# Altium footprint library 元件1.PcbLib: 420 footprints (part 10 of 27)
Each footprint in its own frame and in the unit in brackets; x right, y up, seen from the top. Pads: shape width x height; smd on the part's side, far side on the other; paste and mask are expansions set on the pad; w line width, h text height; cw(c..) or ccw(c..) is an arc to the next point about the centre after c.
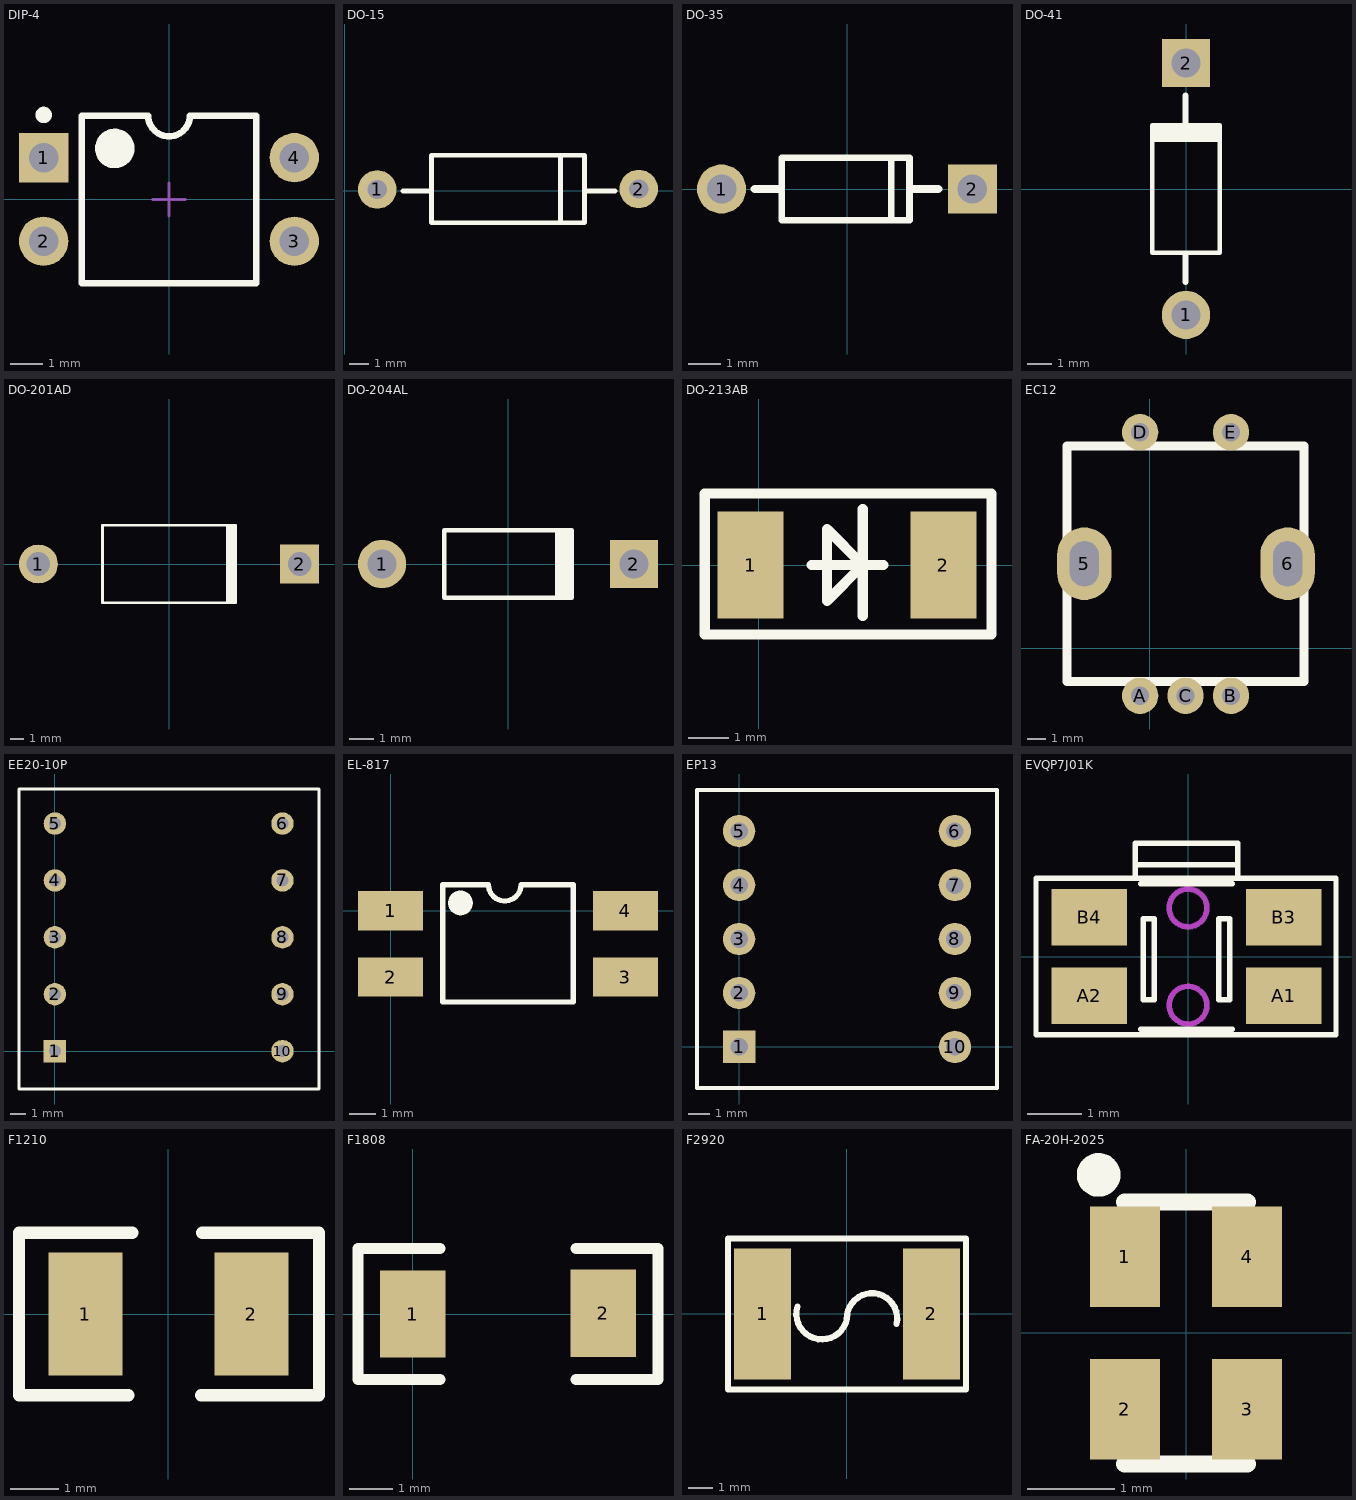
[diagram p9: the footprints below, top view; thin cyan lines are the x and y axes]

## DIP-4 [mm] "光耦（未加焊）"
height 5.6
pads (4):
  rect 1.5x1.5 hole 0.9: 1(-3.81,1.27)
  round 1.5 hole 0.9: 2(-3.81,-1.27) 3(3.81,-1.27) 4(3.81,1.27)
Top Overlay:
  circle w0.25: c-3.81,2.57 r0.125
  circle w0.6: c-1.65,1.55 r0.3
  lines w0.2: -2.65,-2.55 -2.65,2.55 -0.635,2.55 ccw(c0,2.55) 0.635,2.55 2.65,2.55 2.65,-2.55 -2.65,-2.55
Mechanical 15:
  lines w0.1: -0.5,0 0.5,0 ; 0,-0.5 0,0.5
3D body "DIP-4_N.stp": height 4.78, standoff -3, extent -3.915,-2.25 3.925,2.27

## DO-15 [mm] "DO-15"
pads (2):
  round 2 hole 1: 1(1.676,0.076) 2(15.265,0.102)
Top Overlay:
  lines w0.254: 3.023,0 4.445,0 ; 11.201,-1.651 11.201,1.854 ; 11.709,-1.651 11.735,-1.651 ; 12.522,0 14.046,0 ; 4.496,-1.651 4.496,1.854 12.446,1.854 12.446,-1.651 4.496,-1.651
3D body "DO-15.step": height 4.78, standoff -1, extent 1.245,-1.676 15.705,1.889

## DO-35 [mm] "DO-204AH"
pads (2):
  round 1.5 hole 0.9: 1(-3.835,0)
  rect 1.5x1.5 hole 0.9: 2(3.835,0)
Top Overlay:
  lines w0.2: 1.352,-0.95 1.352,0.95 ; 1.899,-0.95 -2.001,-0.95 -2.001,0.95 1.899,0.95 ; 1.911,-0.95 1.911,0.95
  lines w0.254: -2.819,0 -2.026,0 ; 1.956,0 2.794,0
3D body "1N4007.STEP": height 3.33, standoff -1, extent -4.216,-1.321 4.191,1.346

## DO-41 [mm]
pads (2):
  round 2 hole 1.2: 1(0,-5.23)
  rect 2x2 hole 1.2: 2(0,5.23)
Top Overlay:
  region: 1.4,1.95 1.4,2.75 -1.4,2.75 -1.4,1.95
  lines w0.2: -1.4,2.65 -1.4,-2.65 1.4,-2.65 1.4,2.65
  lines w0.254: -0.025,-3.858 -0.025,-2.69 ; -0.025,2.466 -0.025,3.889
3D body "DO-41.STEP": height 3.3, standoff -2, extent -1.279,-5.599 1.321,5.461

## DO-201AD [mm] "Diode, Axial; Body 9.5 x 5.6 mm (LxDia. max), Lead Dia. 1.32 mm (max)"
height 5.6
pads (2):
  round 2.8 hole 1.7: 1(-9.42,0)
  rect 2.8x2.8 hole 1.7: 2(9.42,0)
Top Overlay:
  rectangle: 4.1,-2.8 4.9,2.8
  lines w0.2: 4.8,-2.8 -4.8,-2.8 -4.8,2.8 4.8,2.8
3D body "DO-201AD.STEP": height 4.51, standoff -1, extent -9.754,-2.505 9.746,2.515

## DO-204AL [mm] "Diode, Axial; Body 5.2 x 2.7 mm (LxDia. max), Lead Dia. 0.86 mm (max)"
height 2.7
pads (2):
  round 2 hole 1.2: 1(-5.23,0)
  rect 2x2 hole 1.2: 2(5.23,0)
Top Overlay:
  rectangle: 1.95,-1.4 2.75,1.4
  lines w0.2: 2.65,-1.4 -2.65,-1.4 -2.65,1.4 2.65,1.4
3D body "DO-204AL.STEP": height 3.51, standoff -1, extent -5.542,-1.521 5.588,1.499

## DO-213AB [mil] "LL4150X25MM"
pads (2):
  rect 65x105 smd: 1(-8,0) 2(181,0)
Top Overlay:
  lines w10: 52,0 122,0 ; 102,-50 102,55 ; -53,-68 228,-68 228,70 -53,70 -53,-68 ; 67,-35 102,0 67,35 67,-35
3D body "DO-213AB.step": height 52.56, standoff -52.56, extent -17.36,-52.12 187.36,53

## EC12 [mm] "编码器"
pads (7):
  oval 3x4 hole 1.6 slot 2.5 at 90 deg: 5(-3.607,4.648) 6(7.569,4.648)
  round 2 hole 1: A(-0.544,-2.616) B(4.456,-2.616) C(1.956,-2.616) D(-0.544,11.884) E(4.456,11.884)
Top Overlay:
  lines w0.508: -4.561,-1.829 -4.561,11.125 8.469,11.125 8.469,-1.829 -4.561,-1.829
3D body "EC12E-bushing-20.STEP": height 20.05, standoff -3.5, extent -5.014,-2.87 8.977,11.379

## EE20-10P [mm] "EF20"
height 0.272
pads (10):
  rect 1.5x1.5 hole 0.813: 1(0,0)
  round 1.5 hole 0.813: 2(0,3.8) 3(0,7.6) 4(0,11.4) 5(0,15.2) 6(15.2,15.2) 7(15.2,11.4) 8(15.2,7.6) 9(15.2,3.8) 10(15.2,0)
Top Overlay:
  lines w0.2: -2.396,-2.53 17.638,-2.53 17.638,17.506 -2.396,17.506 -2.396,-2.53
3D body "EF20_5+5.STEP": height 14.24, standoff -2.36, extent -2.619,-2.791 17.881,17.709

## EL-817 [mm]
pads (4):
  rect 2.5x1.5 smd: 1(0,0) 2(0,-2.54) 3(9,-2.54) 4(9,0)
Top Overlay:
  circle w0.5: c2.676,0.3 r0.224
  lines w0.2: 3.7,1 2,1 2,-3.5 7,-3.5 7,1 5,1 cw(c4.375,1) 3.75,1
3D body "User Library-4-SMD.STEP": height 3.75, standoff -0.01, extent -0.52,-3.569 9.64,1.029

## EP13 [mm]
height 0.272
pads (10):
  rect 1.5x1.5 hole 0.813: 1(0,0)
  round 1.5 hole 0.813: 2(0,2.5) 3(0,5) 4(0,7.5) 5(0,10) 6(10,10) 7(10,7.5) 8(10,5) 9(10,2.5) 10(10,0)
Top Overlay:
  lines w0.2: -1.95,-1.9 11.95,-1.9 11.95,11.9 -1.95,11.9 -1.95,-1.9
3D body "EP13.step": height 12.4, standoff -4, extent -1.501,-1.502 11.501,11.5

## EVQP7J01K [mm] "PUSH BUTTON SWITCH"
pads (4):
  rect 1.4x1.05 smd: A1(1.772,-0.722) A2(-1.828,-0.722) B3(1.772,0.728) B4(-1.828,0.728)
Top Overlay:
  lines w0.1: -0.978,1.703 0.922,1.703 ; -0.878,-1.347 0.822,-1.347 ; -0.878,1.353 0.822,1.353 ; -0.978,1.453 0.922,1.453 ; -0.978,1.453 -2.819,1.453 -2.819,-1.447 2.743,-1.447 2.743,1.453 0.922,1.453 ; -0.978,1.453 -0.978,2.103 0.922,2.103 0.922,1.703 ; 0.922,1.453 0.922,1.703 ; -0.828,-0.797 -0.828,0.703 -0.628,0.703 -0.628,-0.797 -0.828,-0.797 ; 0.572,-0.797 0.572,0.703 0.772,0.703 0.772,-0.797 0.572,-0.797
Keep-Out Layer:
  circle w0.1: c0,-0.9 r0.35
  circle w0.1: c0,0.91 r0.35
Mechanical 1:
  circle w0.1: c0,-0.9 r0.35
  circle w0.1: c0,0.9 r0.35
3D body "User Library-EVQP7-JA-01P.STEP": height 1.35, standoff 0, extent -2.35,-1.46 2.35,2.09

## F1210 [mil]
pads (2):
  rect 60x100 smd: 1(-67.5,0) 2(67.5,0)
Top Overlay:
  lines w10: -32.5,-66 -121.5,-66 -121.5,66 -29.5,66 ; 26.5,-66 122.5,-66 122.5,66 ; 27.5,66 121.3,66
3D body "User Library-Fuse1210.step": height 26.57, standoff 0, extent -63.78,-50.68 62.79,50.69

## F1808 [mil]
pads (2):
  rect 60x80 smd: 1(0,0) 2(174.88,0.76)
Top Overlay:
  lines w10: 25,-60 -50,-60 -50,60 25,60 ; 150,-60 225,-60 225,60 150,60
3D body "R1808(4520M)1.STEP": height 39.37, standoff 0, extent -2.88,-37.48 174.88,39

## F2920 [mm] "7452"
pads (2):
  rect 2.3x5.3 smd: 1(-3.4,0) 2(3.4,0)
Top Overlay:
  lines w0.254: -2,0.3 ccw(c-1.012,0.007) 0.018,0 ; -0.009,-0.2 cw(c1.008,-0.178) 2,-0.4 ; -4.8,-3.048 4.8,-3.048 4.8,3.048 -4.8,3.048 -4.8,-3.048
3D body: height 1, standoff 0, extent 2.7,-2.692 3.399,2.692
3D body: height 1, standoff 0, extent -3.576,-2.718 -2.878,2.667
3D body: height 1, standoff 0, extent -2.878,-2.718 3.18,2.667

## FA-20H-2025 [mm]
height 0.5
pads (4):
  rect 0.8x1.15 smd: 1(-0.7,0.875) 2(-0.7,-0.875) 3(0.7,-0.875) 4(0.7,0.875)
Top Overlay:
  circle w0.25: c-1,1.81 r0.125
  lines w0.2: -0.7,-1.5 0.7,-1.5 ; -0.7,1.5 0.7,1.5
3D body "FA-20H-2025.STEP": height 0.5, standoff 0, extent -1.005,-1.25 0.995,1.25